# Altium schematic symbol library AliPadash.SchLib: 1186 symbols (part 5 of 6) (continued)
## STV6888 (continued)
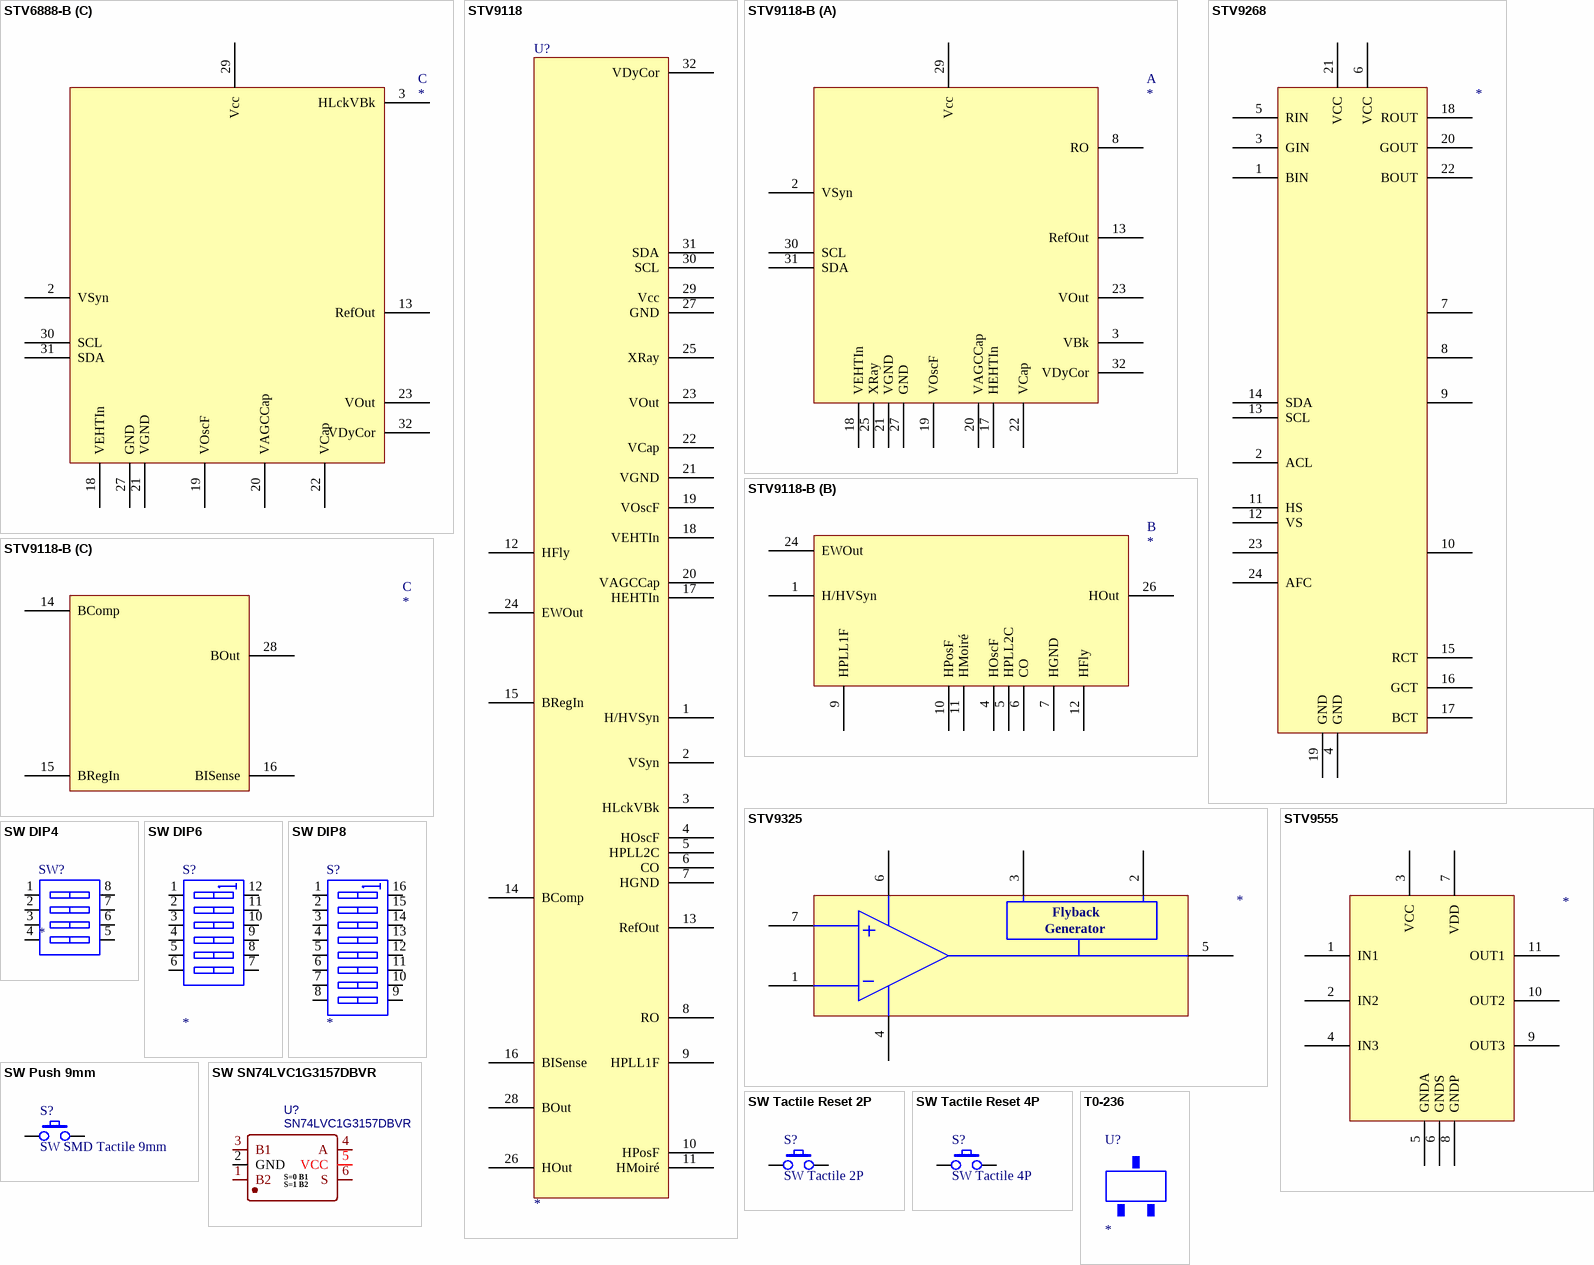
[diagram p63: symbols STV6888-B to T0-236]

## STV6888-B
designator ?
part A pins: 1 HSync, 4 HOscF, 5 HPLL2C, 6 CO, 7 HGND, 8 RO, 9 HPLL1F, 10 HPosF, 11 HMoire, 12 HFly, 17 HEHTIn, 24 EWOut, 26 HOut
part B pins: 14 BComp, 15 BRegIn, 16 BISense, 25 XRay, 28 BOut
part C pins: 2 VSyn, 3 HLckVBk, 13 RefOut, 18 VEHTIn, 19 VOscF, 20 VAGCCap, 21 VGND, 22 VCap, 23 VOut, 27 GND, 29 Vcc, 30 SCL, 31 SDA, 32 VDyCor

## STV9118
designator U?
pins: 1 H/HVSyn, 2 VSyn, 3 HLckVBk, 4 HOscF, 5 HPLL2C, 6 CO, 7 HGND, 8 RO, 9 HPLL1F, 10 HPosF, 11 HMoiré, 12 HFly, 13 RefOut, 14 BComp, 15 BRegIn, 16 BISense, 17 HEHTIn, 18 VEHTIn, 19 VOscF, 20 VAGCCap, 21 VGND, 22 VCap, 23 VOut, 24 EWOut, 25 XRay, 26 HOut, 27 GND, 28 BOut, 29 Vcc, 30 SCL, 31 SDA, 32 VDyCor

## STV9118-B
designator ?
part A pins: 2 VSyn, 3 VBk, 8 RO, 13 RefOut, 17 HEHTIn, 18 VEHTIn, 19 VOscF, 20 VAGCCap, 21 VGND, 22 VCap, 23 VOut, 25 XRay, 27 GND, 29 Vcc, 30 SCL, 31 SDA, 32 VDyCor
part B pins: 1 H/HVSyn, 4 HOscF, 5 HPLL2C, 6 CO, 7 HGND, 9 HPLL1F, 10 HPosF, 11 HMoiré, 12 HFly, 24 EWOut, 26 HOut
part C pins: 14 BComp, 15 BRegIn, 16 BISense, 28 BOut

## STV9268
designator ?
pins: 1 BIN, 2 ACL, 3 GIN, 4 GND, 5 RIN, 6 VCC, 7, 8, 9, 10, 11 HS, 12 VS, 13 SCL, 14 SDA, 15 RCT, 16 GCT, 17 BCT, 18 ROUT, 19 GND, 20 GOUT, 21 VCC, 22 BOUT, 23, 24 AFC

## STV9325
designator ?
pins: 1, 2, 3, 4, 5, 6, 7
text: Flyback; Generator

## STV9555
designator ?
pins: 1 IN1, 2 IN2, 3 VCC, 4 IN3, 5 GNDA, 6 GNDS, 7 VDD, 8 GNDP, 9 OUT3, 10 OUT2, 11 OUT1

## SW DIP4
designator SW?
footprint SWDIP8
pins: 1 A1, 2 A2, 3 A3, 4 A4, 5 A5, 6 A6, 7 A7, 8 A8

## SW DIP6
designator S?
pins: 1 A1, 2 A2, 3 A3, 4 A4, 5 A5, 6 A6, 7 B6, 8 B5, 9 B4, 10 B3, 11 B2, 12 B1

## SW DIP8
designator S?
pins: 1 A1, 2 A2, 3 A3, 4 A4, 5 A5, 6 A6, 7 A7, 8 A8, 9 B8, 10 B7, 11 B6, 12 B5, 13 B4, 14 B3, 15 B2, 16 B1

## SW Push 9mm
designator S?, comment SW SMD Tactile 9mm
MFAC: TS-1109S-C-L; JLC: C840835
footprint SW SMD_4P-L4.5-W4.5-P3.00-LS7.0 (Footprint not found)
pins: 1, 2

## SW SN74LVC1G3157DBVR
designator U?, comment SN74LVC1G3157DBVR
Manufacturer: TI(德州仪器); sourceId: sx7jTtqoY; spicePre: X; timeStamp: 1453888299; Supplier: LCSC; Manufacturer Part: SN74LVC1G3157DBVR; Supplier Part: C10426; JLCPCB Part Class: Extended Part; spiceSymbolName: SN74LVC1G3157DBVR; JLC: C3040658; MFAC: SN74LVC1G3157DBVR
footprint SOT-23-6_L2.9-W1.6-P0.95-LS2.8-BR
pins: 1 B2, 2 GND, 3 B1, 4 A, 5 VCC, 6 S
text: S=0 B1; S=1 B2

## SW Tactile Reset 2P
designator S?, comment SW Tactile 2P
MFAC: TS-1101-C-W; JLC: C318938
footprint SW-SMD_L6.0-W3.3-LS8.0 (Footprint not found)
pins: 1, 2

## SW Tactile Reset 4P
designator S?, comment SW Tactile 4P
MFAC: TS-1187A-B-A-B; JLC: C318884
footprint swTactile
pins: 1, 2

## T0-236
designator U?

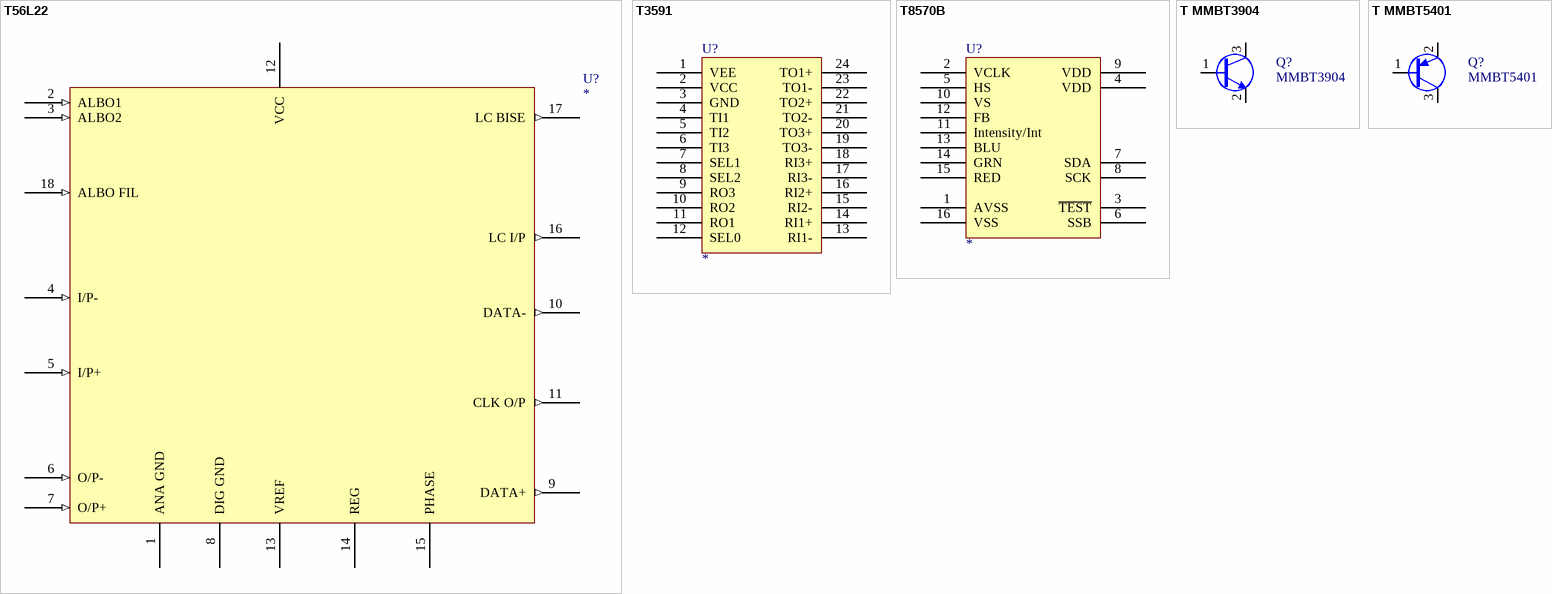
[diagram p64: symbols T56L22 to T MMBT5401]

## T56L22
designator U?
pins: 1 ANA GND, 2 ALBO1 (in), 3 ALBO2 (in), 4 I/P- (in), 5 I/P+ (in), 6 O/P- (in), 7 O/P+ (in), 8 DIG GND, 9 DATA+ (out), 10 DATA- (out), 11 CLK O/P (out), 12 VCC, 13 VREF, 14 REG, 15 PHASE, 16 LC I/P (out), 17 LC BISE (out), 18 ALBO FIL (in)

## T3591
designator U?
footprint SOI-24
pins: 1 VEE, 2 VCC, 3 GND, 4 TI1, 5 TI2, 6 TI3, 7 SEL1, 8 SEL2, 9 RO3, 10 RO2, 11 RO1, 12 SEL0, 13 RI1-, 14 RI1+, 15 RI2-, 16 RI2+, 17 RI3-, 18 RI3+, 19 TO3-, 20 TO3+, 21 TO2-, 22 TO2+, 23 TO1-, 24 TO1+

## T8570B
designator U?
footprint SO-16
footprint DIP16
pins: 1 AVSS, 2 VCLK, 3 ~{TEST}, 4 VDD, 5 HS, 6 SSB, 7 SDA, 8 SCK, 9 VDD, 10 VS, 11 Intensity/Int, 12 FB, 13 BLU, 14 GRN, 15 RED, 16 VSS

## T MMBT3904
designator Q?, comment MMBT3904
JLC: C20526; MFAC: MMBT3904
footprint SMD-23
footprint TO-92
footprint TO-220
pins: 1 B, 2 E, 3 C

## T MMBT5401
designator Q?, comment MMBT5401
JLC: C8326; MFAC: MMBT5401
footprint SMD-23
footprint TO-92
footprint TO-220
pins: 1 B, 2 E, 3 C

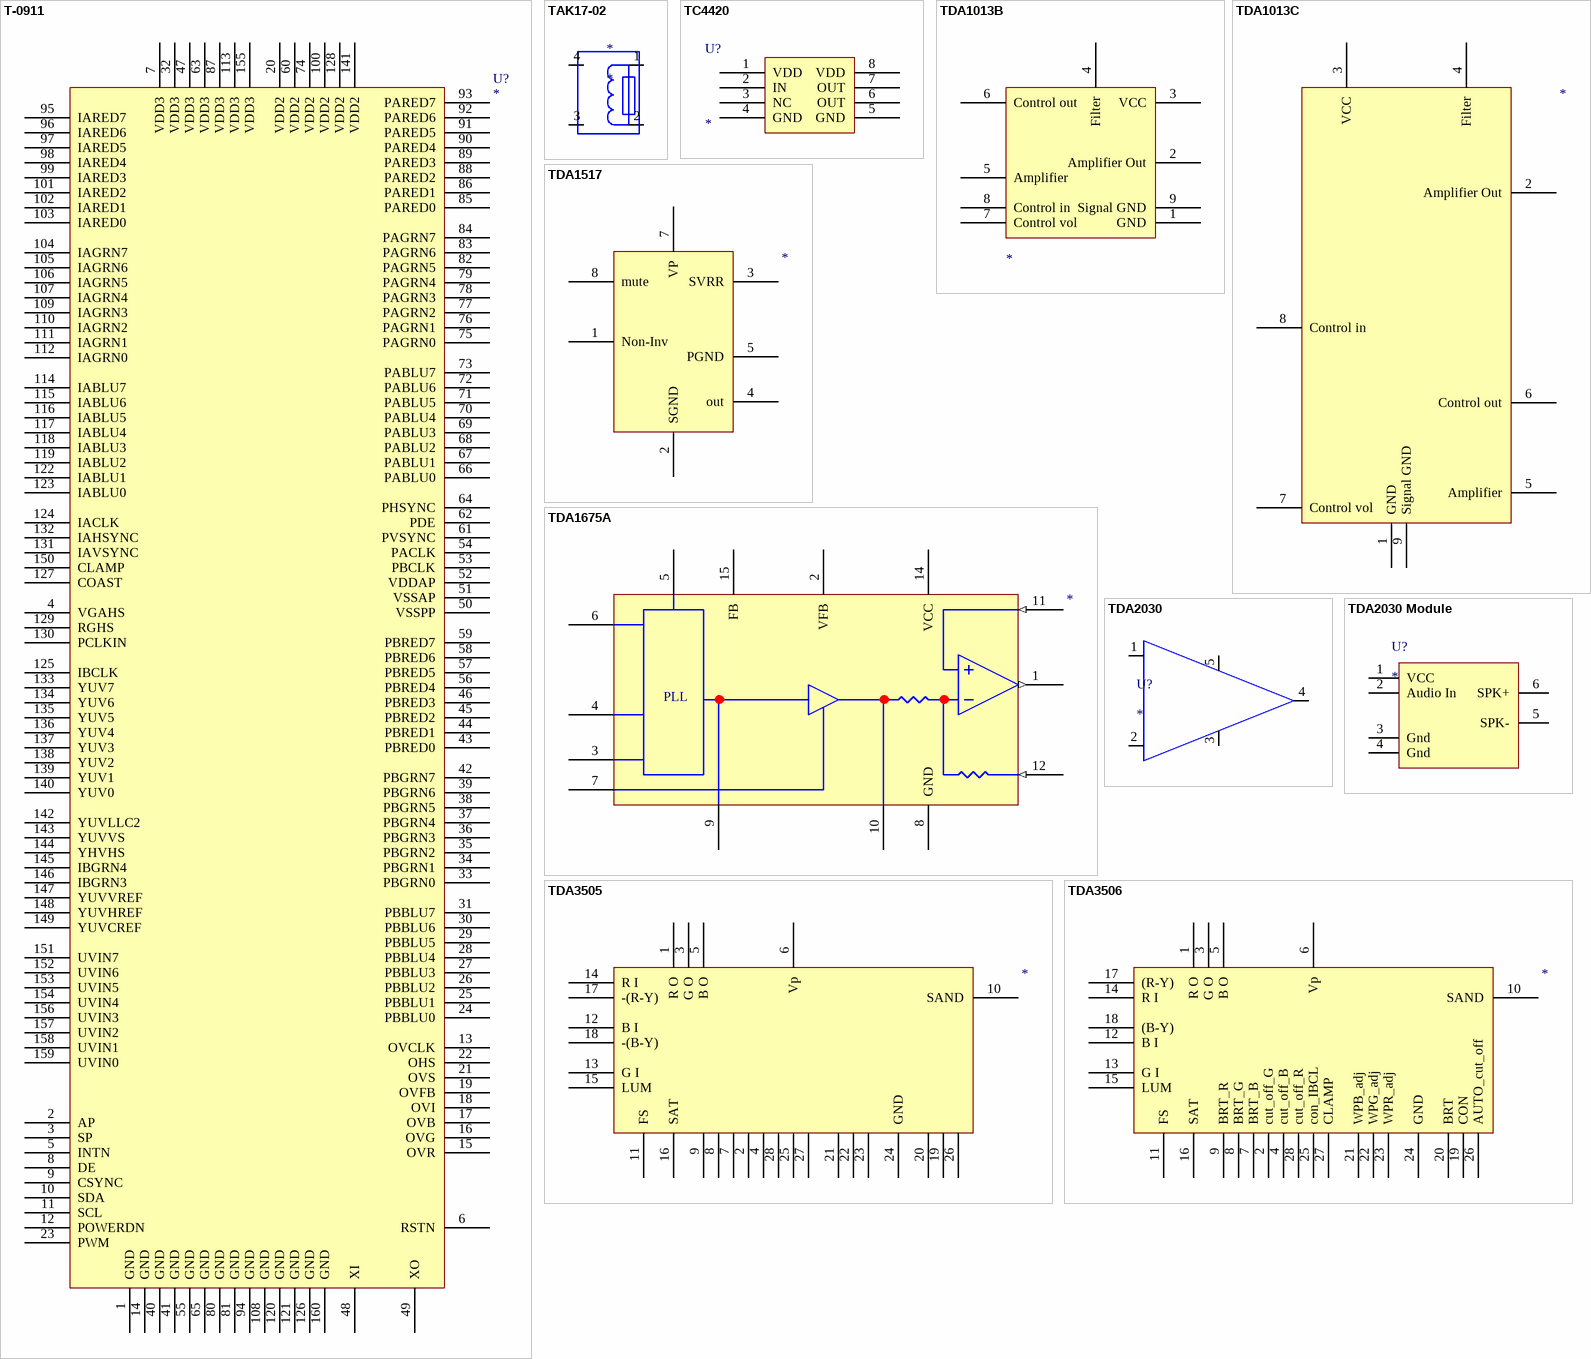
[diagram p65: symbols T-0911 to TDA3506]

## T-0911
designator U?
footprint PQFP160
pins: 1 GND, 2 AP, 3 SP, 4 VGAHS, 5 INTN, 6 RSTN, 7 VDD3, 8 DE, 9 CSYNC, 10 SDA, 11 SCL, 12 POWERDN, 13 OVCLK, 14 GND, 15 OVR, 16 OVG, 17 OVB, 18 OVI, 19 OVFB, 20 VDD2, 21 OVS, 22 OHS, 23 PWM, 24 PBBLU0, 25 PBBLU1, 26 PBBLU2, 27 PBBLU3, 28 PBBLU4, 29 PBBLU5, 30 PBBLU6, 31 PBBLU7, 32 VDD3, 33 PBGRN0, 34 PBGRN1, 35 PBGRN2, 36 PBGRN3, 37 PBGRN4, 38 PBGRN5, 39 PBGRN6, 40 GND, 41 GND, 42 PBGRN7, 43 PBRED0, 44 PBRED1, 45 PBRED2, 46 PBRED3, 47 VDD3, 48 XI, 49 XO, 50 VSSPP, 51 VSSAP, 52 VDDAP, 53 PBCLK, 54 PACLK, 55 GND, 56 PBRED4, 57 PBRED5, 58 PBRED6, 59 PBRED7, 60 VDD2, 61 PVSYNC, 62 PDE, 63 VDD3, 64 PHSYNC, 65 GND, 66 PABLU0, 67 PABLU1, 68 PABLU2, 69 PABLU3, 70 PABLU4, 71 PABLU5, 72 PABLU6, 73 PABLU7, 74 VDD2, 75 PAGRN0, 76 PAGRN1, 77 PAGRN2, 78 PAGRN3, 79 PAGRN4, 80 GND, 81 GND, 82 PAGRN5, 83 PAGRN6, 84 PAGRN7, 85 PARED0, 86 PARED1, 87 VDD3, 88 PARED2, 89 PARED3, 90 PARED4, 91 PARED5, 92 PARED6, 93 PARED7, 94 GND, 95 IARED7, 96 IARED6, 97 IARED5, 98 IARED4, 99 IARED3, 100 VDD2, 101 IARED2, 102 IARED1, 103 IARED0, 104 IAGRN7, 105 IAGRN6, 106 IAGRN5, 107 IAGRN4, 108 GND, 109 IAGRN3, 110 IAGRN2, 111 IAGRN1, 112 IAGRN0, 113 VDD3, 114 IABLU7, 115 IABLU6, 116 IABLU5, 117 IABLU4, 118 IABLU3, 119 IABLU2, 120 GND, 121 GND, 122 IABLU1, 123 IABLU0, 124 IACLK, 125 IBCLK, 126 GND, 127 COAST, 128 VDD2, 129 RGHS, 130 PCLKIN, 131 IAVSYNC, 132 IAHSYNC, 133 YUV7, 134 YUV6, 135 YUV5, 136 YUV4, 137 YUV3, 138 YUV2, 139 YUV1, 140 YUV0, 141 VDD2, 142 YUVLLC2, 143 YUVVS, 144 YHVHS, 145 IBGRN4, 146 IBGRN3, 147 YUVVREF, 148 YUVHREF, 149 YUVCREF, 150 CLAMP, 151 UVIN7, 152 UVIN6, 153 UVIN5, 154 UVIN4, 155 VDD3, 156 UVIN3, 157 UVIN2, 158 UVIN1, 159 UVIN0, 160 GND

## TAK17-02
designator *
footprint TAK17
pins: 1, 2, 3, 4

## TC4420
designator U?
footprint DIP8
pins: 1 VDD, 2 IN, 3 NC, 4 GND, 5 GND, 6 OUT, 7 OUT, 8 VDD

## TDA1013B
designator ?
pins: 1 GND, 2 Amplifier Out, 3 VCC, 4 Filter, 5 Amplifier, 6 Control out, 7 Control vol, 8 Control in, 9 Signal GND

## TDA1013C
designator ?
pins: 1 GND, 2 Amplifier Out, 3 VCC, 4 Filter, 5 Amplifier, 6 Control out, 7 Control vol, 8 Control in, 9 Signal GND

## TDA1517
designator ?
pins: 1 Non-Inv, 2 SGND, 3 SVRR, 4 out, 5 PGND, 7 VP, 8 mute

## TDA1675A
designator ?
pins: 1 (out), 2 VFB, 3, 4, 5, 6, 7, 8 GND, 9, 10, 11 (in), 12 (in), 14 VCC, 15 FB
text: PLL

## TDA2030
designator U?
footprint Pentawatt5PIN (Footprint not found)
pins: 1, 2, 3, 4, 5

## TDA2030 Module
designator U?
pins: 1 VCC, 2 Audio In, 3 Gnd, 4 Gnd, 5 SPK-, 6 SPK+

## TDA3505
designator ?
pins: 1 R O, 2, 3 G O, 4, 5 B O, 6 Vp, 7, 8, 9, 10 SAND, 11 FS, 12 B I, 13 G I, 14 R I, 15 LUM, 16 SAT, 17 -(R-Y), 18 -(B-Y), 19, 20, 21, 22, 23, 24 GND, 25, 26, 27, 28

## TDA3506
designator ?
pins: 1 R O, 2 cut_off_G, 3 G O, 4 cut_off_B, 5 B O, 6 Vp, 7 BRT_B, 8 BRT_G, 9 BRT_R, 10 SAND, 11 FS, 12 B I, 13 G I, 14 R I, 15 LUM, 16 SAT, 17 (R-Y), 18 (B-Y), 19 CON, 20 BRT, 21 WPB_adj, 22 WPG_adj, 23 WPR_adj, 24 GND, 25 con_IBCL, 26 AUTO_cut_off, 27 CLAMP, 28 cut_off_R

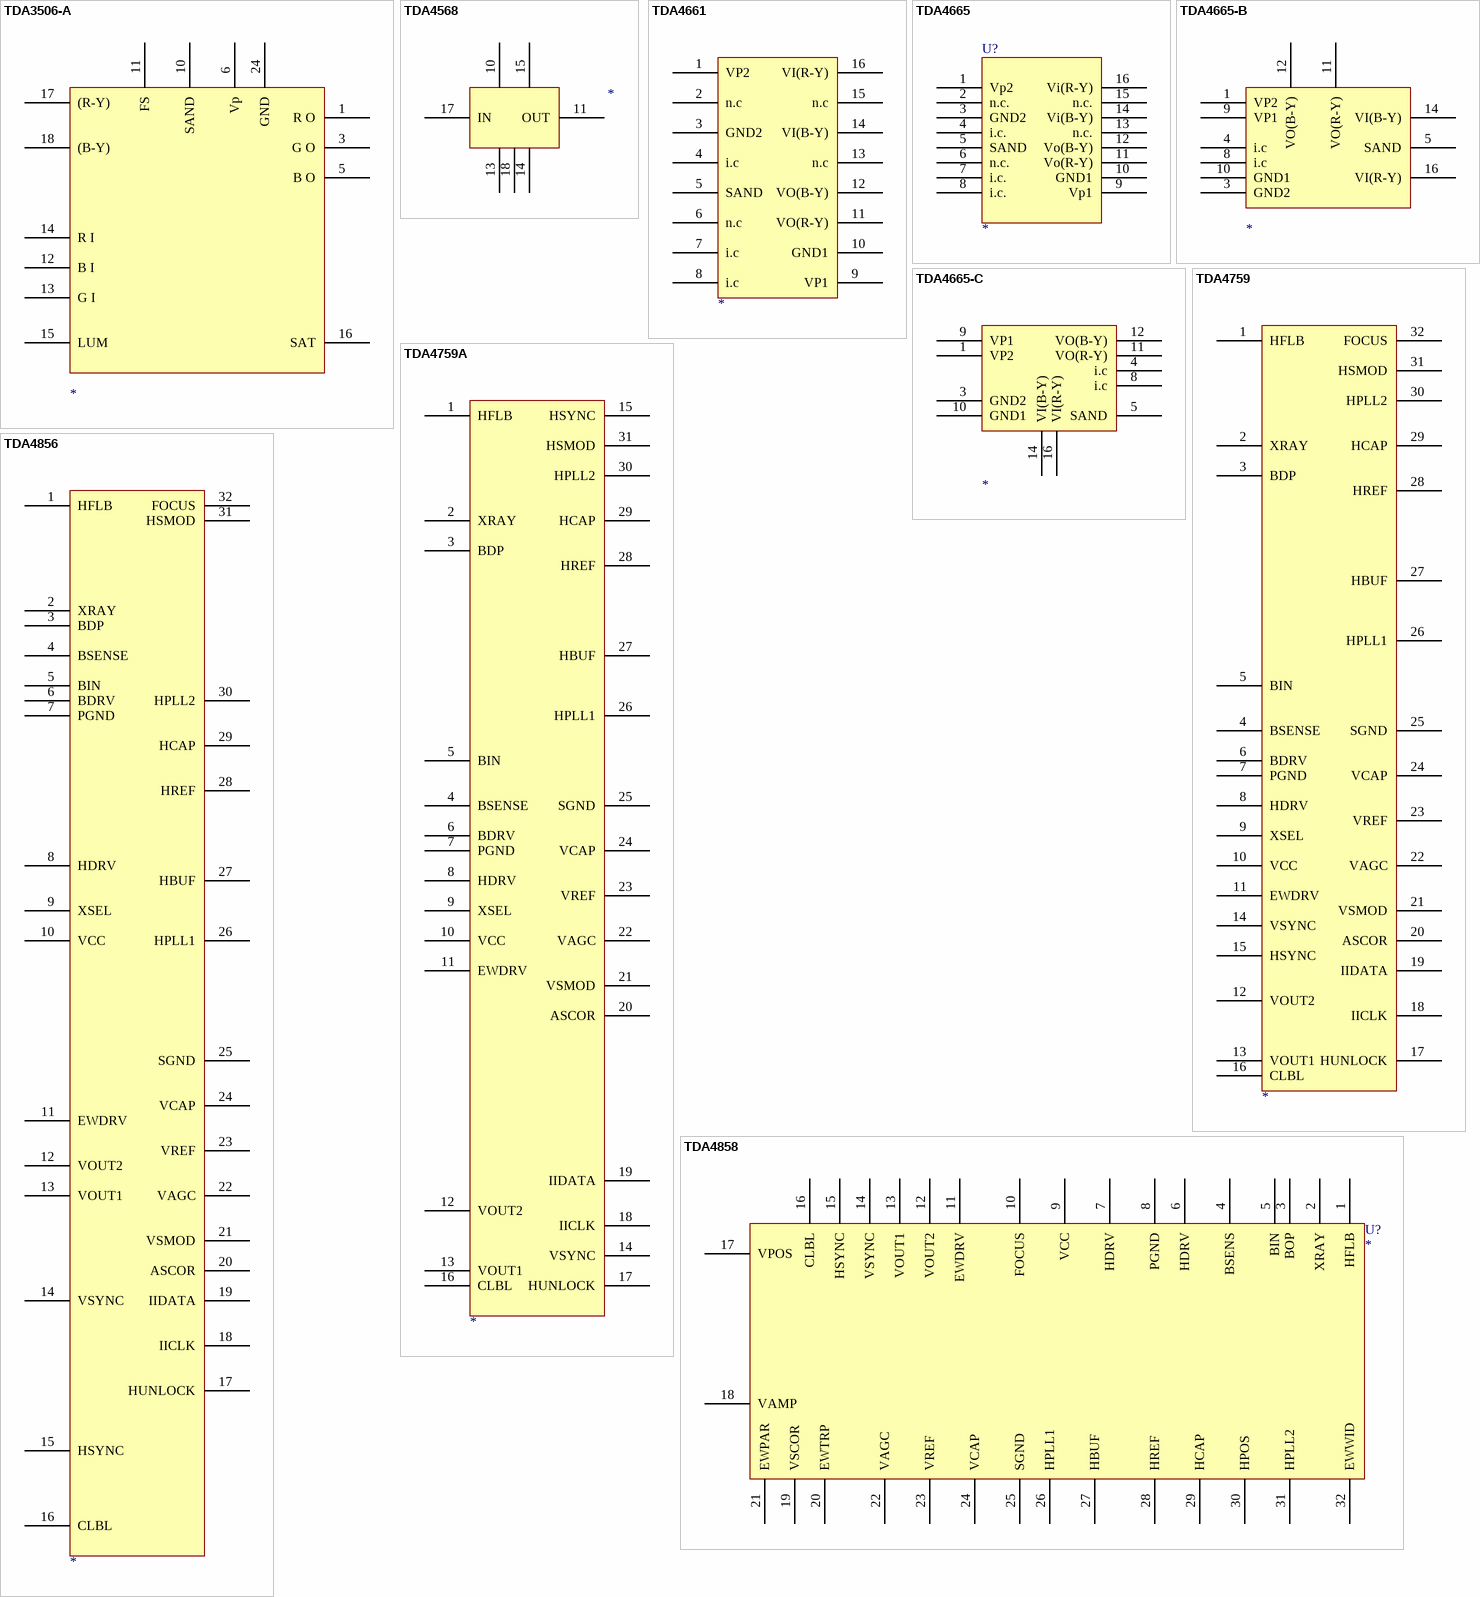
[diagram p66: symbols TDA3506-A to TDA4858]

## TDA3506-A
designator ?
pins: 1 R O, 3 G O, 5 B O, 6 Vp, 10 SAND, 11 FS, 12 B I, 13 G I, 14 R I, 15 LUM, 16 SAT, 17 (R-Y), 18 (B-Y), 24 GND

## TDA4568
designator ?
pins: 10, 11 OUT, 13, 14, 15, 17 IN, 18

## TDA4661
designator ?
pins: 1 VP2, 2 n.c, 3 GND2, 4 i.c, 5 SAND, 6 n.c, 7 i.c, 8 i.c, 9 VP1, 10 GND1, 11 VO(R-Y), 12 VO(B-Y), 13 n.c, 14 VI(B-Y), 15 n.c, 16 VI(R-Y)

## TDA4665
designator U?
Text Field1: Baseband delay line; Text Field2: Supersedes data of 1995 Oct 30; Text Field3: PHILIPS
footprint DIP16
pins: 1 Vp2, 2 n.c., 3 GND2, 4 i.c., 5 SAND, 6 n.c., 7 i.c., 8 i.c., 9 Vp1, 10 GND1, 11 Vo(R-Y), 12 Vo(B-Y), 13 n.c., 14 Vi(B-Y), 15 n.c., 16 Vi(R-Y)

## TDA4665-B
designator ?
pins: 1 VP2, 3 GND2, 4 i.c, 5 SAND, 8 i.c, 9 VP1, 10 GND1, 11 VO(R-Y), 12 VO(B-Y), 14 VI(B-Y), 16 VI(R-Y)

## TDA4665-C
designator ?
pins: 1 VP2, 3 GND2, 4 i.c, 5 SAND, 8 i.c, 9 VP1, 10 GND1, 11 VO(R-Y), 12 VO(B-Y), 14 VI(B-Y), 16 VI(R-Y)

## TDA4759
designator ?
pins: 1 HFLB, 2 XRAY, 3 BDP, 4 BSENSE, 5 BIN, 6 BDRV, 7 PGND, 8 HDRV, 9 XSEL, 10 VCC, 11 EWDRV, 12 VOUT2, 13 VOUT1, 14 VSYNC, 15 HSYNC, 16 CLBL, 17 HUNLOCK, 18 IICLK, 19 IIDATA, 20 ASCOR, 21 VSMOD, 22 VAGC, 23 VREF, 24 VCAP, 25 SGND, 26 HPLL1, 27 HBUF, 28 HREF, 29 HCAP, 30 HPLL2, 31 HSMOD, 32 FOCUS

## TDA4759A
designator ?
pins: 1 HFLB, 2 XRAY, 3 BDP, 4 BSENSE, 5 BIN, 6 BDRV, 7 PGND, 8 HDRV, 9 XSEL, 10 VCC, 11 EWDRV, 12 VOUT2, 13 VOUT1, 14 VSYNC, 15 HSYNC, 16 CLBL, 17 HUNLOCK, 18 IICLK, 19 IIDATA, 20 ASCOR, 21 VSMOD, 22 VAGC, 23 VREF, 24 VCAP, 25 SGND, 26 HPLL1, 27 HBUF, 28 HREF, 29 HCAP, 30 HPLL2, 31 HSMOD

## TDA4856
designator ?
pins: 1 HFLB, 2 XRAY, 3 BDP, 4 BSENSE, 5 BIN, 6 BDRV, 7 PGND, 8 HDRV, 9 XSEL, 10 VCC, 11 EWDRV, 12 VOUT2, 13 VOUT1, 14 VSYNC, 15 HSYNC, 16 CLBL, 17 HUNLOCK, 18 IICLK, 19 IIDATA, 20 ASCOR, 21 VSMOD, 22 VAGC, 23 VREF, 24 VCAP, 25 SGND, 26 HPLL1, 27 HBUF, 28 HREF, 29 HCAP, 30 HPLL2, 31 HSMOD, 32 FOCUS

## TDA4858
designator U?
pins: 1 HFLB, 2 XRAY, 3 BOP, 4 BSENS, 5 BIN, 6 HDRV, 7 HDRV, 8 PGND, 9 VCC, 10 FOCUS, 11 EWDRV, 12 VOUT2, 13 VOUT1, 14 VSYNC, 15 HSYNC, 16 CLBL, 17 VPOS, 18 VAMP, 19 VSCOR, 20 EWTRP, 21 EWPAR, 22 VAGC, 23 VREF, 24 VCAP, 25 SGND, 26 HPLL1, 27 HBUF, 28 HREF, 29 HCAP, 30 HPOS, 31 HPLL2, 32 EWWID

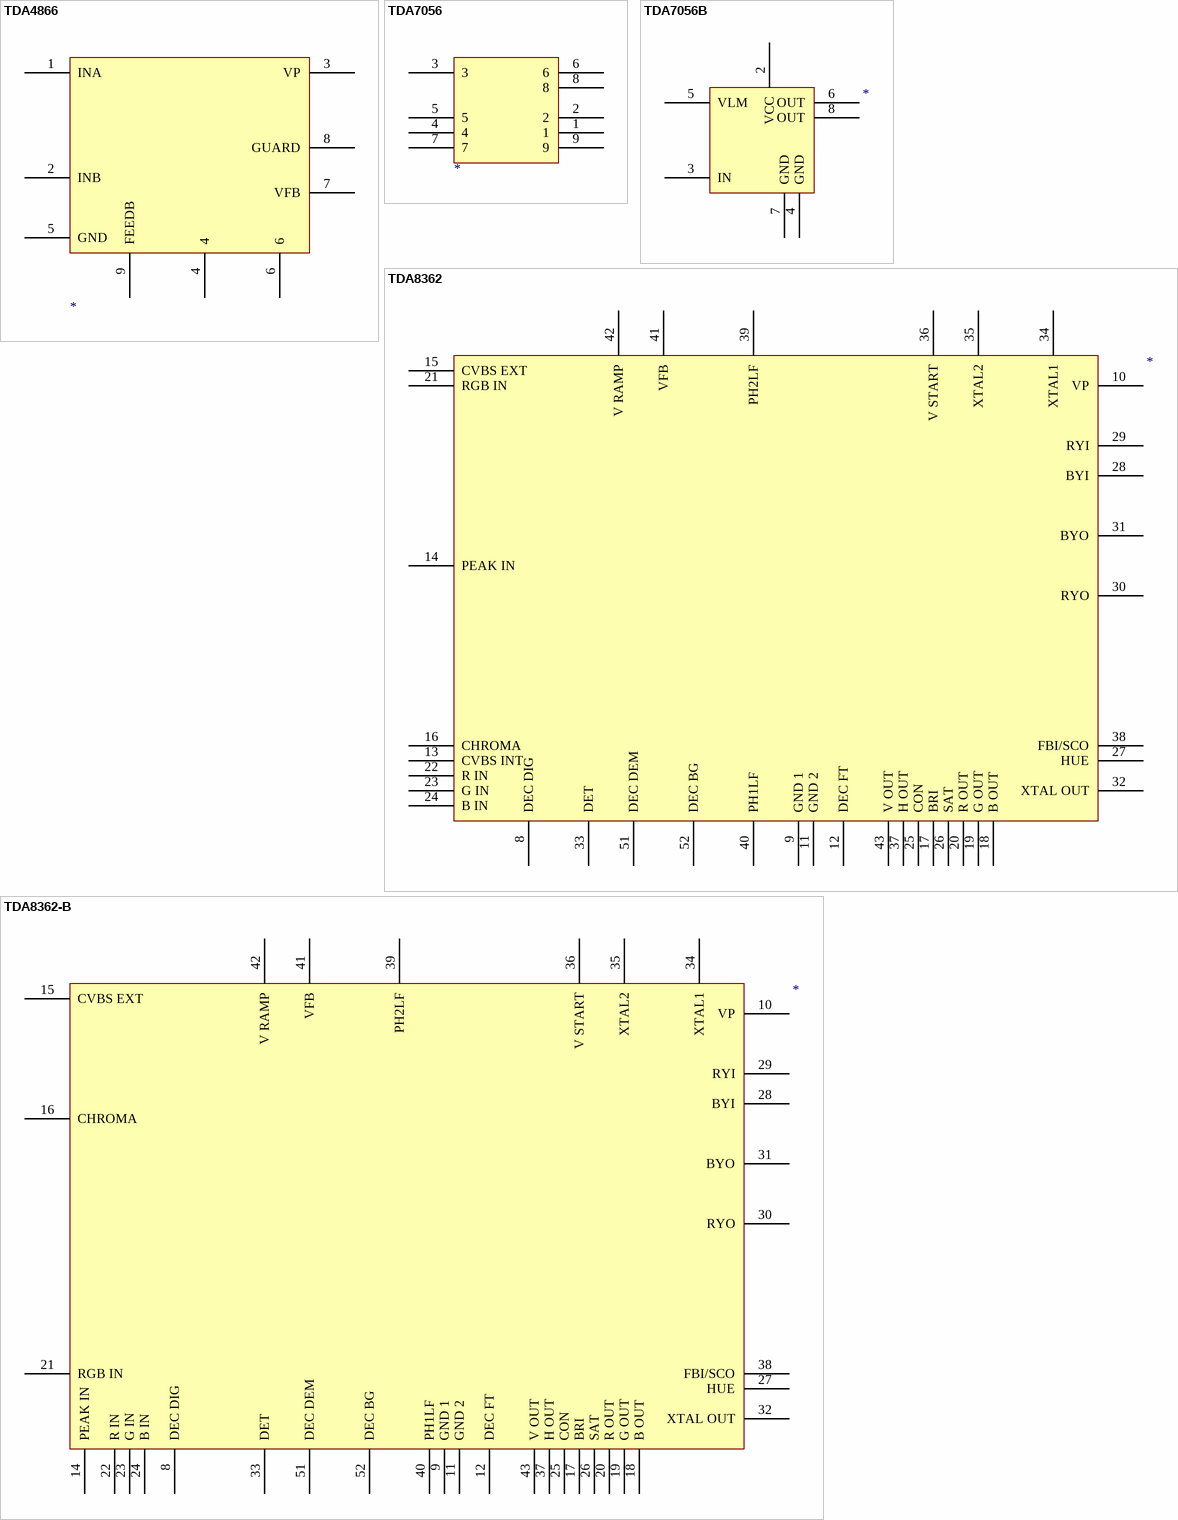
[diagram p67: symbols TDA4866 to TDA8362-B]

## TDA4866
designator ?
U?
pins: 1 INA, 2 INB, 3 VP, 4, 5 GND, 6, 7 VFB, 8 GUARD, 9 FEEDB

## TDA7056
designator ?
pins: 1, 2, 3, 4, 5, 6, 7, 8, 9

## TDA7056B
designator ?
pins: 2 VCC, 3 IN, 4 GND, 5 VLM, 6 OUT, 7 GND, 8 OUT

## TDA8362
designator ?
U?
footprint DIP52
pins: 8 DEC DIG, 9 GND 1, 10 VP, 11 GND 2, 12 DEC FT, 13 CVBS INT, 14 PEAK IN, 15 CVBS EXT, 16 CHROMA, 17 BRI, 18 B OUT, 19 G OUT, 20 R OUT, 21 RGB IN, 22 R IN, 23 G IN, 24 B IN, 25 CON, 26 SAT, 27 HUE, 28 BYI, 29 RYI, 30 RYO, 31 BYO, 32 XTAL OUT, 33 DET, 34 XTAL1, 35 XTAL2, 36 V START, 37 H OUT, 38 FBI/SCO, 39 PH2LF, 40 PH1LF, 41 VFB, 42 V RAMP, 43 V OUT, 51 DEC DEM, 52 DEC BG

## TDA8362-B
designator ?
pins: 8 DEC DIG, 9 GND 1, 10 VP, 11 GND 2, 12 DEC FT, 14 PEAK IN, 15 CVBS EXT, 16 CHROMA, 17 BRI, 18 B OUT, 19 G OUT, 20 R OUT, 21 RGB IN, 22 R IN, 23 G IN, 24 B IN, 25 CON, 26 SAT, 27 HUE, 28 BYI, 29 RYI, 30 RYO, 31 BYO, 32 XTAL OUT, 33 DET, 34 XTAL1, 35 XTAL2, 36 V START, 37 H OUT, 38 FBI/SCO, 39 PH2LF, 40 PH1LF, 41 VFB, 42 V RAMP, 43 V OUT, 51 DEC DEM, 52 DEC BG

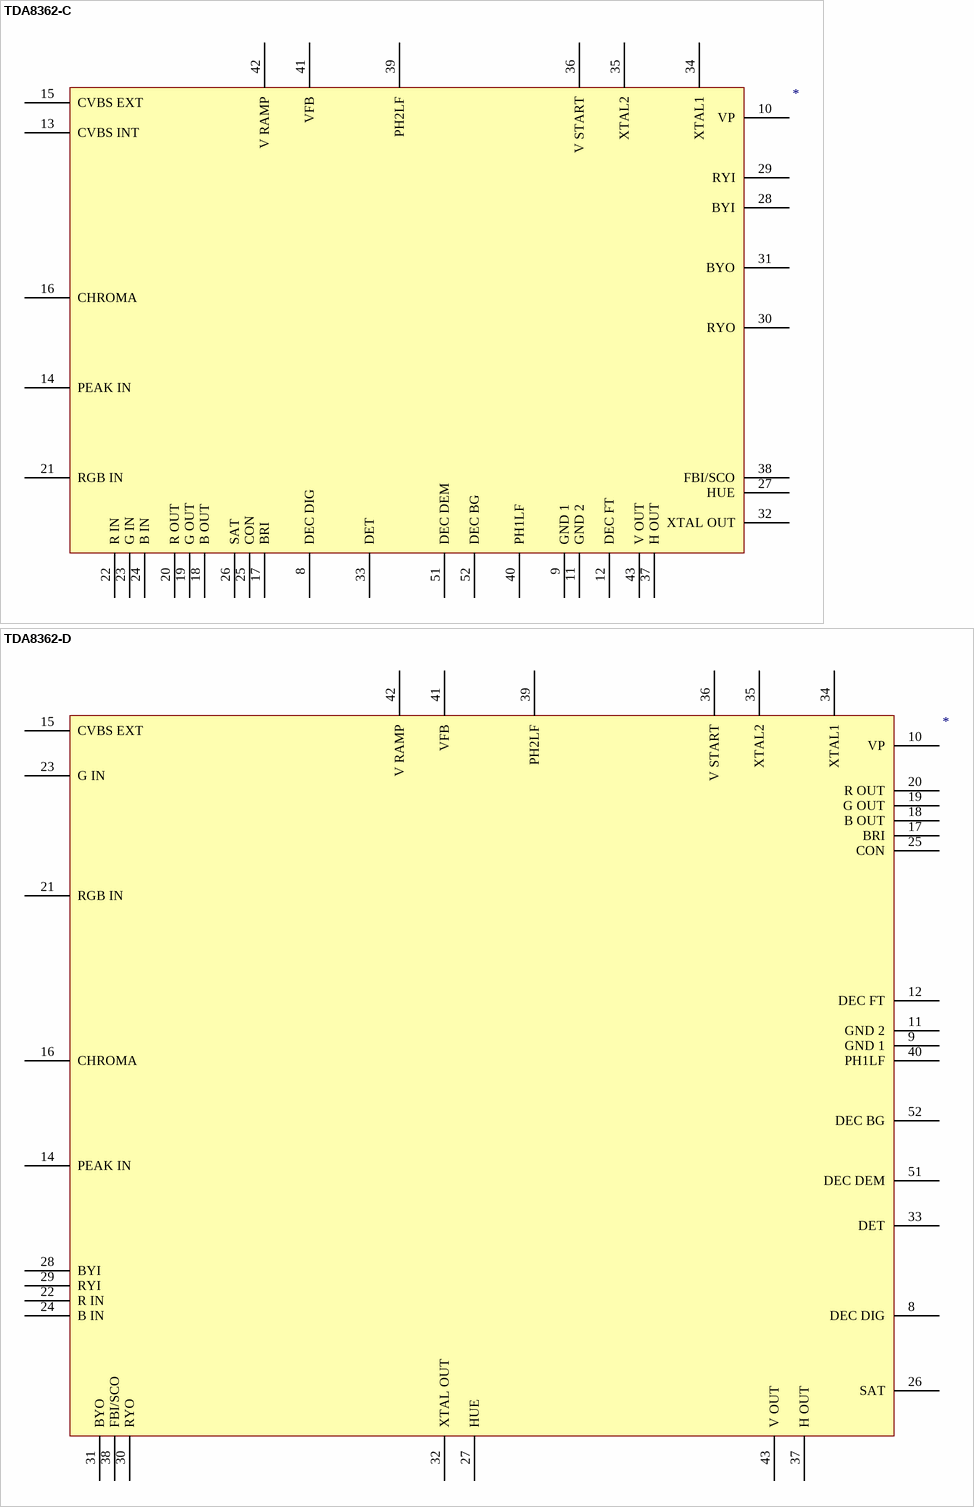
[diagram p68: symbols TDA8362-C to TDA8362-D]

## TDA8362-C
designator ?
pins: 8 DEC DIG, 9 GND 1, 10 VP, 11 GND 2, 12 DEC FT, 13 CVBS INT, 14 PEAK IN, 15 CVBS EXT, 16 CHROMA, 17 BRI, 18 B OUT, 19 G OUT, 20 R OUT, 21 RGB IN, 22 R IN, 23 G IN, 24 B IN, 25 CON, 26 SAT, 27 HUE, 28 BYI, 29 RYI, 30 RYO, 31 BYO, 32 XTAL OUT, 33 DET, 34 XTAL1, 35 XTAL2, 36 V START, 37 H OUT, 38 FBI/SCO, 39 PH2LF, 40 PH1LF, 41 VFB, 42 V RAMP, 43 V OUT, 51 DEC DEM, 52 DEC BG

## TDA8362-D
designator ?
pins: 8 DEC DIG, 9 GND 1, 10 VP, 11 GND 2, 12 DEC FT, 14 PEAK IN, 15 CVBS EXT, 16 CHROMA, 17 BRI, 18 B OUT, 19 G OUT, 20 R OUT, 21 RGB IN, 22 R IN, 23 G IN, 24 B IN, 25 CON, 26 SAT, 27 HUE, 28 BYI, 29 RYI, 30 RYO, 31 BYO, 32 XTAL OUT, 33 DET, 34 XTAL1, 35 XTAL2, 36 V START, 37 H OUT, 38 FBI/SCO, 39 PH2LF, 40 PH1LF, 41 VFB, 42 V RAMP, 43 V OUT, 51 DEC DEM, 52 DEC BG
